# Altium integrated library ib_eps.IntLib: 181 symbols (part 1 of 2) (continued)
## CL0603_2700pF_50V (continued)
CAP CER 2700PF 50V X7R 0603; Manufacturer: Yageo; Manufacturer Part Number: CC0603KRX7R9BB272; Voltage: 50V; Value: 2700pF; Dielectric: X7R; Supplier 1: Digi-Key; Supplier Part Number 1: 311-1809-1-ND
footprint C0603_IPC_HD (Chip Capacitor, 2-Leads, Body 1,60x0,80mm, IPC High Density)
pins: 1, 2

## CL0603_4700pF_50V
designator C?, comment 4700pF
4700pF ±10% 50V Ceramic Capacitor X7R 0603 (1608 Metric); Manufacturer: Wurth Electronics Inc.; Manufacturer Part Number: 885012206087; Voltage: 50V; Value: 4700pF; Dielectric: X7R; Supplier 1: Digi-Key; Supplier Part Number 1: 732-8005-1-ND
footprint C0603_IPC_MD (Chip Capacitor, 2-Leads, Body 1,60x0,80mm, IPC Medium Density)
footprint C0603_IPC_HD (Chip Capacitor, 2-Leads, Body 1,60x0,80mm, IPC High Density)
pins: 1, 2

## CL0805_10uF_25V
designator C?, comment 10uF
10µF ±10% 25V Ceramic Capacitor X5R 0805 (2012 Metric); Manufacturer: Taiyo Yuden; Manufacturer Part Number: TMK212BBJ106KG-T; Dielectric: X7R; Voltage: 25V; Value: 10uF; Supplier 1: Digi-Key; Supplier Part Number 1: 587-2985-1-ND
footprint C0805_IPC_MD (Chip Capacitor, 2-Leads, Body 2,00x1,25mm, IPC Medium Density)
footprint C0805_IPC_HD (Chip Capacitor, 2-Leads, Body 2,00x1,25mm, IPC High Density)
pins: 1, 2

## CL1206_10nF_1000V
designator C?, comment 10nF
CAP CER 10000PF 1000V X7R 1206; Manufacturer: Wurth Electronics Inc.; Manufacturer Part Number: 885342208021; Voltage: 1000V; Value: 10nF; Dielectric: X7R; Supplier 1: Digi-Key; Supplier Part Number 1: 732-12078-1-ND
footprint Chip2Pin1206_10n
footprint C1206_IPC_HD (Chip Capacitor, 2-Leads, Body 3,20x1,60mm, IPC High Density)
footprint C1206_IPC_MD (Chip Capacitor, 2-Leads, Body 3,20x1,60mm, IPC Medium Density)
pins: 1, 2

## CL1206_47uF_10V
designator C?, comment 47µF
CAP CER 47UF 10V X5R 1206; Manufacturer: Samsung Electro-Mechanics; Manufacturer Part Number: CL31A476MPHNNNE; Dielectric: X7R; Voltage: 10V; Value: 47µF; Supplier 1: Digi-Key; Supplier Part Number 1: 1276-3063-1-ND
footprint C1206_IPC_HD (Chip Capacitor, 2-Leads, Body 3,20x1,60mm, IPC High Density)
footprint C1206_IPC_MD (Chip Capacitor, 2-Leads, Body 3,20x1,60mm, IPC Medium Density)
pins: 1, 2

## CM3
designator M?  (mechanical)
COMPUTE MODULE RASPBERRYPI3; Manufacturer: Raspberry Pi; Manufacturer Part Number: CM3; Supplier 1: Digi-Key; Supplier Part Number 1: 1690-1016-ND

## CM3 LITE
designator M?  (mechanical)
COMPUTE MODULE RASPBERRYPI3 LITE; Manufacturer: Raspberry Pi; Manufacturer Part Number: CM3 LITE; Supplier 1: Digi-Key; Supplier Part Number 1: 1690-1017-ND

## CP22uF_16V
designator C?, comment 22µF
CAP 22 UF 20% 16 V; Manufacturer: Wurth Electronics Inc.; Manufacturer Part Number: 865080340003; Voltage: 16V; Dielectric: X7R; Value: 22µF; Supplier 1: Digi-Key; Supplier Part Number 1: 732-8413-1-ND
footprint CP22uF_16VCAPAE4643X55M (Aluminum Electrolytic Capacitor, Body 4,30x4,30x5,50mm, IPC Low Density)
pins: 1, 2

## CP68uF_16V
designator C?, comment 68µF
68µF 16V Aluminum Electrolytic Capacitors Radial, Can - SMD  2000 Hrs @ 105°C; Manufacturer: Panasonic Electronic Components; Manufacturer Part Number: EEE-FK1C680P; Dielectric: X7R; Voltage: 16V; Value: 68µF; Supplier 1: Digi-Key; Supplier Part Number 1: PCE3793CT-ND
footprint EEE-FK1CP68uF_CAPAE6666X58M (Aluminum Electrolytic Capacitor, Body 7,00x6,60x5,80mm, IPC Low Density)
pins: 1, 2

## CP100uF_16V
designator C?, comment 100uF
CAP ALUM 100UF 20% 16V SMD; Manufacturer: Panasonic Electronic Components; Manufacturer Part Number: EEE-HC1C101XP; Dielectric: X7R; Voltage: 16V; Value: 100uF; Supplier 1: Digi-Key; Supplier Part Number 1: PCE3750CT-ND
footprint CAPAE7866X77_100uF16V (Aluminum Electrolytic Capacitor, Body 6,60x6,60x7,70mm, IPC Low Density)
pins: 1, 2

## CP2102N-A01-GQFN28R
designator U?
USB Bridge, USB to UART USB 2.0 UART Interface 28-QFN (5x5); Manufacturer: Silicon Labs; Manufacturer Part Number: CP2102N-A01-GQFN28R; Supplier 1: Digi-Key; Supplier Part Number 1: 336-4738-1-ND
footprint CP2102\9_QFN50P500X500X80_HS-29N (QFN, 28-Leads, Body 5,00x5,00mm, Pitch 0,50mm, Thermal Pad 3,35x3,35mm, IPC Medium Density)
pins: 1 DCD, 2 RI/CLK, 3 GND, 4 D+, 5 D-, 6 VDD, 7 VREGIN, 8 VBUS, 9 ~{RESET}, 10 NC, 11 ~{SUSPEND}, 12 SUSPEND, 13 CHREN, 14 CHR1, 15 CHR0, 16 GPIO.3/WAKEUP, 17 GPIO.2/RS485, 18 GPIO.1/RXT, 19 GPIO.0/TXT, 20 GPIO.6, 21 GPIO.5, 22 GPIO.4, 23 CTS, 24 RTS, 25 RXD, 26 TXD, 27 DSR, 28 DTR, 29 PGND

## CP2102N-A02-GQFN24
designator U?
USB Bridge, USB to UART USB 2.0 UART Interface 24-QFN (4x4); Manufacturer: Silicon Labs; Manufacturer Part Number: CP2102N-A02-GQFN24; Supplier 1: Digi-Key; Supplier Part Number 1: 336-5887-ND
footprint CP2102_QFN50P400X400X80_HS-25N (QFN, 24-Leads, Body 4,00x4,00mm, Pitch 0,50mm, Thermal Pad 2,55x2,55mm, IPC Medium Density)
pins: 1 RI/CLK, 2 GND, 3 D+, 4 D-, 5 VIO, 6 VDD, 7 VREGIN, 8 VBUS, 9 RSTb, 10 NC, 11 GPIO.3/WAKEUP, 12 GPIO.2/RS485, 13 GPIO.1/RXT, 14 GPIO.0/TXT, 15 SUSPENDb, 16 NC, 17 SUSPEND, 18 CTS, 19 RTS, 20 RXD, 21 TXD, 22 DSR, 23 DTR, 24 DCD, 25 PGND

## CPT68uF_16V
designator C?, comment 68µF
68µF Molded Tantalum Polymer Capacitor 16V 2917 (7343 Metric) 50 mOhm; Manufacturer: AVX Corporation; Manufacturer Part Number: TCJY686M016R0050; Dielectric: X7R; Voltage: 16V; Value: 68µF; Supplier 1: Digi-Key; Supplier Part Number 1: 478-9518-1-ND
footprint TCJY686_CAPMP7343X21N (Molded Capacitor, 2-Leads, Body 7,30x4,30mm, IPC Medium Density)
pins: 1, 2

## CR0603-FX-3302
designator R?, comment 33k
RES SMD 33K OHM 1% 1/10W 0603; Manufacturer: Bourns Inc.; Manufacturer Part Number: CR0603-FX-3302ELF; Value: 33k; Tolarance: ±1%; Supplier 1: Digi-Key; Supplier Part Number 1: YAG3389TR-ND
footprint C0603_IPC_MD (Chip Capacitor, 2-Leads, Body 1,60x0,80mm, IPC Medium Density)
footprint C0603_IPC_HD (Chip Capacitor, 2-Leads, Body 1,60x0,80mm, IPC High Density)
pins: 1, 2

## CR0603-J/-000ELF
designator R?, comment 0R
RES SMD 0 OHM JUMPER 1/10W 0603; Manufacturer: Bourns Inc.; Manufacturer Part Number: CR0603-J/-000ELF; Tolarance: 1%; Value: 0R; Supplier 1: Digi-Key; Supplier Part Number 1: CR0603-J/-000ELFCT-ND
footprint C0603_IPC_HD (Chip Capacitor, 2-Leads, Body 1,60x0,80mm, IPC High Density)
footprint C0805_IPC_MD (Chip Capacitor, 2-Leads, Body 2,00x1,25mm, IPC Medium Density)
pins: 1, 2

## CR0603-JW-1k_ISL92
designator R?, comment 1 k
1 kOhms ±1% 0.1W, 1/10W Chip Resistor 0603 (1608 Metric) Automotive AEC-Q200 Thick Film; Manufacturer: Stackpole Electronics Inc; Manufacturer Part Number: RMCF0603FT1K00; Value: 1 k; Tolarance: ±1%; Supplier 1: Digi-Key; Supplier Part Number 1: RMCF0603FT1K00CT-ND
footprint R0603_IPC_HD (Chip Resistor, 2-Leads, Body 1,60x0,80mm, IPC Medium Density)
footprint R0603_IPC_MD (Chip Resistor, 2-Leads, Body 1,60x0,80mm, IPC Medium Density)
pins: 1, 2

## CR0603-JW-2R
designator R?, comment 2R
2 Ohms ±1% 0.125W, 1/8W Chip Resistor 0603 (1608 Metric) Automotive AEC-Q200 Thick Film; Manufacturer: KOA Speer Electronics, Inc.; Manufacturer Part Number: RK73H1JTTD2R00F; Value: 2R; Tolarance: ±1%; Supplier 1: Digi-Key; Supplier Part Number 1: 2019-RK73H1JTTD2R00FCT-ND
footprint C0603_IPC_HD (Chip Capacitor, 2-Leads, Body 1,60x0,80mm, IPC High Density)
footprint C0603_IPC_MD (Chip Capacitor, 2-Leads, Body 1,60x0,80mm, IPC Medium Density)
pins: 1, 2

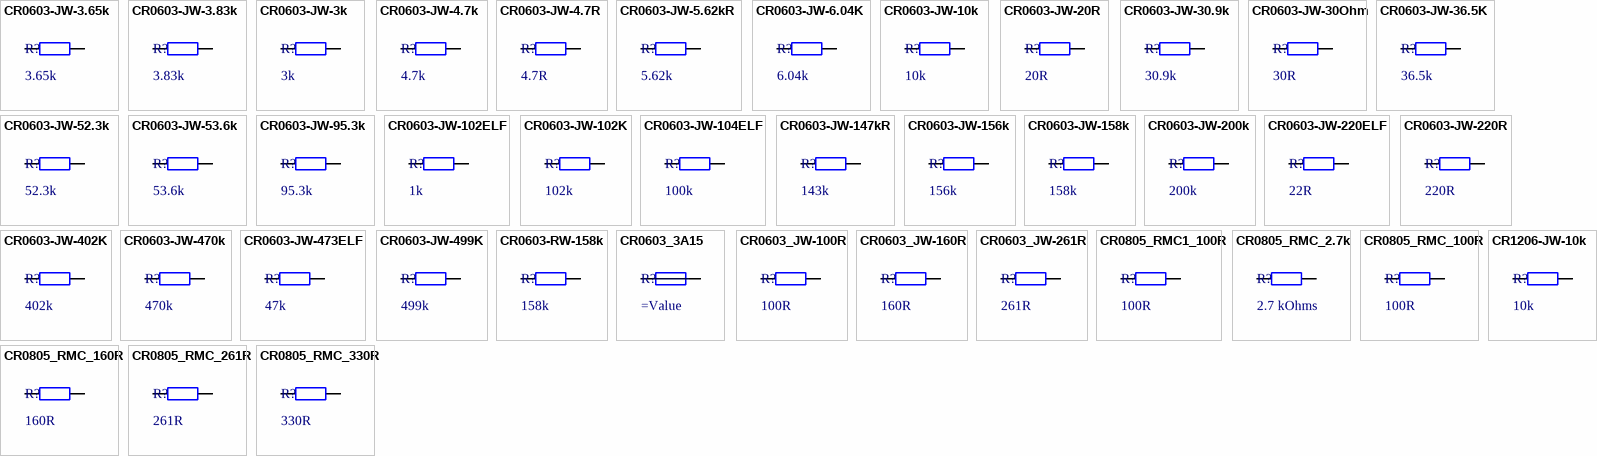
[diagram p3: symbols CR0603-JW-3.65k to CR1206-JW-10k]

## CR0603-JW-3.65k
designator R?, comment 3.65k
RES SMD 3.65K OHM 1% 1/10W 0603; Manufacturer: Yageo; Manufacturer Part Number: RC0603FR-073K65L; Value: 3.65k; Tolarance: ±1%; Supplier 1: Digi-Key; Supplier Part Number 1: 311-3.65KHRCT-ND
footprint C0603_IPC_HD (Chip Capacitor, 2-Leads, Body 1,60x0,80mm, IPC High Density)
pins: 1, 2

## CR0603-JW-3.83k
designator R?, comment 3.83k
RES SMD 3.83K OHM 1% 1/10W 0603; Manufacturer: Yageo; Manufacturer Part Number: RC0603FR-073K83L; Value: 3.83k; Tolarance: ±1%; Supplier 1: Digi-Key; Supplier Part Number 1: 311-3.83KHRCT-ND
footprint C0603_IPC_HD (Chip Capacitor, 2-Leads, Body 1,60x0,80mm, IPC High Density)
pins: 1, 2

## CR0603-JW-3k
designator R?, comment 3k
RES SMD 3K OHM 5% 1/10W 0603; Manufacturer: Bourns Inc.; Manufacturer Part Number: CR0603-JW-302ELF; Value: 3k; Tolarance: ±5%; Supplier 1: Digi-Key; Supplier Part Number 1: CR0603-JW-302ELFCT-ND
footprint C0603_IPC_HD (Chip Capacitor, 2-Leads, Body 1,60x0,80mm, IPC High Density)
footprint C0603_IPC_MD (Chip Capacitor, 2-Leads, Body 1,60x0,80mm, IPC Medium Density)
pins: 1, 2

## CR0603-JW-4.7k
designator R?, comment 4.7k
RES SMD 4.7K OHM 5% 1/10W 0603; Manufacturer: Bourns Inc.; Manufacturer Part Number: CR0603-JW-472ELF; Value: 4.7k; Tolarance: ±5%; Supplier 1: Digi-Key; Supplier Part Number 1: CR0603-JW-472ELFCT-ND
footprint R0603_IPC_HD (Chip Resistor, 2-Leads, Body 1,60x0,80mm, IPC Medium Density)
footprint R0603_IPC_MD (Chip Resistor, 2-Leads, Body 1,60x0,80mm, IPC Medium Density)
pins: 1, 2

## CR0603-JW-4.7R
designator R?, comment 4.7R
RES 4.7 OHM 1% 1/10W 0603; Manufacturer: Stackpole Electronics Inc; Manufacturer Part Number: RMCF0603FT4R70; Value: 4.7R; Tolarance: ±1%; Supplier 1: Digi-Key; Supplier Part Number 1: RMCF0603FT4R70CT-ND
footprint R0603_IPC_HD (Chip Resistor, 2-Leads, Body 1,60x0,80mm, IPC Medium Density)
footprint R0603_IPC_MD (Chip Resistor, 2-Leads, Body 1,60x0,80mm, IPC Medium Density)
pins: 1, 2

## CR0603-JW-5.62kR
designator R?, comment 5.62k
RES 5.62K OHM 1% 1/10W 0603; Manufacturer: Stackpole Electronics Inc; Manufacturer Part Number: RMCF0603FT5K62; Value: 5.62k; Tolarance: ±1%; Supplier 1: Digi-Key; Supplier Part Number 1: RMCF0603FT5K62CT-ND
footprint C0603_IPC_HD (Chip Capacitor, 2-Leads, Body 1,60x0,80mm, IPC High Density)
footprint C0603_IPC_MD (Chip Capacitor, 2-Leads, Body 1,60x0,80mm, IPC Medium Density)
pins: 1, 2

## CR0603-JW-6.04K
designator R?, comment 6.04k
RES 6.04K OHM 1% 1/10W 0603; Manufacturer: Stackpole Electronics Inc; Manufacturer Part Number: RMCF0603FT6K04; Value: 6.04k; Tolarance: ±1%; Supplier 1: Digi-Key; Supplier Part Number 1: RMCF0603FT6K04CT-ND
footprint C0603_IPC_HD (Chip Capacitor, 2-Leads, Body 1,60x0,80mm, IPC High Density)
footprint C0603_IPC_MD (Chip Capacitor, 2-Leads, Body 1,60x0,80mm, IPC Medium Density)
pins: 1, 2

## CR0603-JW-10k
designator R?, comment 10k
RES 10K OHM 1% 1/10W 0603; Manufacturer: Stackpole Electronics Inc; Manufacturer Part Number: RMCF0603FT10K0; Value: 10k; Tolarance: ±1%; Supplier 1: Digi-Key; Supplier Part Number 1: RMCF0603FT10K0CT-ND
footprint C0603_IPC_HD (Chip Capacitor, 2-Leads, Body 1,60x0,80mm, IPC High Density)
footprint C0603_IPC_MD (Chip Capacitor, 2-Leads, Body 1,60x0,80mm, IPC Medium Density)
pins: 1, 2

## CR0603-JW-20R
designator R?, comment 20R
RES 20 OHM 1% 1/10W 0603; Manufacturer: Stackpole Electronics Inc; Manufacturer Part Number: RMCF0603FT20R0; Value: 20R; Tolarance: ±1%; Supplier 1: Digi-Key; Supplier Part Number 1: RMCF0603FT20R0CT-ND
footprint C0603_IPC_HD (Chip Capacitor, 2-Leads, Body 1,60x0,80mm, IPC High Density)
footprint C0603_IPC_MD (Chip Capacitor, 2-Leads, Body 1,60x0,80mm, IPC Medium Density)
pins: 1, 2

## CR0603-JW-30.9k
designator R?, comment 30.9k
RES SMD 30.9K OHM 1% 1/10W 0603; Manufacturer: Yageo; Manufacturer Part Number: RC0603FR-0730K9L; Value: 30.9k; Tolarance: ±1%; Supplier 1: Digi-Key; Supplier Part Number 1: 311-30.9KHRCT-ND
footprint C0603_IPC_HD (Chip Capacitor, 2-Leads, Body 1,60x0,80mm, IPC High Density)
pins: 1, 2

## CR0603-JW-30Ohm
designator R?, comment 30R
RES SMD 30 OHM 5% 1/10W 0603; Manufacturer: Bourns Inc.; Manufacturer Part Number: CR0603-JW-300ELF; Value: 30R; Tolarance: ±5%; Supplier 1: Digi-Key; Supplier Part Number 1: CR0603-JW-300ELFCT-ND
footprint C0603_IPC_HD (Chip Capacitor, 2-Leads, Body 1,60x0,80mm, IPC High Density)
footprint C0603_IPC_MD (Chip Capacitor, 2-Leads, Body 1,60x0,80mm, IPC Medium Density)
pins: 1, 2

## CR0603-JW-36.5K
designator R?, comment 36.5k
RES 36.5K OHM 1% 1/10W 0603; Manufacturer: KOA Speer Electronics, Inc.; Manufacturer Part Number: RK73H1JTTD3652F; Value: 36.5k; Tolarance: ±1%; Supplier 1: Digi-Key; Supplier Part Number 1: 2019-RK73H1JTTD3652FCT-ND
footprint C0603_IPC_HD (Chip Capacitor, 2-Leads, Body 1,60x0,80mm, IPC High Density)
pins: 1, 2

## CR0603-JW-52.3k
designator R?, comment 52.3k
RES SMD 52.3K OHM 1% 1/10W 0603; Manufacturer: Yageo; Manufacturer Part Number: RC0603FR-0752K3L; Value: 52.3k; Tolarance: ±1%; Supplier 1: Digi-Key; Supplier Part Number 1: 311-52.3KHRCT-ND
footprint C0603_IPC_HD (Chip Capacitor, 2-Leads, Body 1,60x0,80mm, IPC High Density)
pins: 1, 2

## CR0603-JW-53.6k
designator R?, comment 53.6k
RES 53.6K OHM 1% 1/10W 0603; Manufacturer: KOA Speer Electronics, Inc.; Manufacturer Part Number: RK73H1JTTD5362F; Value: 53.6k; Tolarance: ±1%; Supplier 1: Digi-Key; Supplier Part Number 1: 2019-RK73H1JTTD5362FCT-ND
footprint C0603_IPC_HD (Chip Capacitor, 2-Leads, Body 1,60x0,80mm, IPC High Density)
pins: 1, 2

## CR0603-JW-95.3k
designator R?, comment 95.3k
RES 95.3K OHM 1% 1/10W 0603; Manufacturer: Stackpole Electronics Inc; Manufacturer Part Number: RMCF0603FT95K3; Value: 95.3k; Tolarance: ±1%; Supplier 1: Digi-Key; Supplier Part Number 1: RMCF0603FT95K3CT-ND
footprint C0603_IPC_HD (Chip Capacitor, 2-Leads, Body 1,60x0,80mm, IPC High Density)
footprint C0603_IPC_MD (Chip Capacitor, 2-Leads, Body 1,60x0,80mm, IPC Medium Density)
pins: 1, 2

## CR0603-JW-102ELF
designator R?, comment 1k
RES SMD 1K OHM 5% 1/10W 0603; Manufacturer: Bourns Inc.; Manufacturer Part Number: CR0603-JW-102ELF; Value: 1k; Tolarance: 5%; Supplier 1: Digi-Key; Supplier Part Number 1: CR0603-JW-102ELFCT-ND
footprint C0603_IPC_HD (Chip Capacitor, 2-Leads, Body 1,60x0,80mm, IPC High Density)
footprint C0603_IPC_MD (Chip Capacitor, 2-Leads, Body 1,60x0,80mm, IPC Medium Density)
pins: 1, 2

## CR0603-JW-102K
designator R?, comment 102k
RES 102K OHM 1% 1/10W 0603; Manufacturer: KOA Speer Electronics, Inc.; Manufacturer Part Number: RK73H1JTTD1023F; Value: 102k; Tolarance: ±1%; Supplier 1: Digi-Key; Supplier Part Number 1: 2019-RK73H1JTTD1023FCT-ND
footprint C0603_IPC_HD (Chip Capacitor, 2-Leads, Body 1,60x0,80mm, IPC High Density)
pins: 1, 2

## CR0603-JW-104ELF
designator R?, comment 100k
RES 100K OHM 1% 1/10W 0603; Manufacturer: Stackpole Electronics Inc; Manufacturer Part Number: RMCF0603FT100K; Value: 100k; Tolarance: ±1%; Supplier 1: Digi-Key; Supplier Part Number 1: RMCF0603FT100KCT-ND
footprint C0603_IPC_HD (Chip Capacitor, 2-Leads, Body 1,60x0,80mm, IPC High Density)
footprint C0603_IPC_MD (Chip Capacitor, 2-Leads, Body 1,60x0,80mm, IPC Medium Density)
footprint R0603_IPC_MD (Chip Resistor, 2-Leads, Body 1,60x0,80mm, IPC Medium Density)
pins: 1, 2

## CR0603-JW-147kR
designator R?, comment 143k
RES 143K OHM 1% 1/10W 0603; Manufacturer: Stackpole Electronics Inc; Manufacturer Part Number: RMCF0603FT143K; Value: 143k; Tolarance: ±1%; Supplier 1: Digi-Key; Supplier Part Number 1: RMCF0603FT143KCT-ND
footprint C0603_IPC_HD (Chip Capacitor, 2-Leads, Body 1,60x0,80mm, IPC High Density)
footprint C0603_IPC_MD (Chip Capacitor, 2-Leads, Body 1,60x0,80mm, IPC Medium Density)
pins: 1, 2

## CR0603-JW-156k
designator R?, comment 156k
RES 156K OHM 0.1% 1/5W 0805; Manufacturer: Vishay Thin Film; Manufacturer Part Number: PTN0805E1563BST1; Value: 156k; Tolarance: ±0.1%; Supplier 1: Digi-Key; Supplier Part Number 1: 764-1485-1-ND
footprint C0603_IPC_HD (Chip Capacitor, 2-Leads, Body 1,60x0,80mm, IPC High Density)
footprint C0603_IPC_MD (Chip Capacitor, 2-Leads, Body 1,60x0,80mm, IPC Medium Density)
pins: 1, 2

## CR0603-JW-158k
designator R?, comment 158k
58K ±1% 1/10W ±100ppm/℃ 0603; Manufacturer: PANASONIC; Manufacturer Part Number: ERJ3EKF1583V; Value: 158k; Tolarance: 1%; Supplier 1: LCSC; Supplier Part Number 1: C403004
footprint R0603_IPC_HD (Chip Resistor, 2-Leads, Body 1,60x0,80mm, IPC Medium Density)
footprint R0603_IPC_MD (Chip Resistor, 2-Leads, Body 1,60x0,80mm, IPC Medium Density)
pins: 1, 2

## CR0603-JW-200k
designator R?, comment 200k
RES 200K OHM 1% 1/10W 0603; Manufacturer: Stackpole Electronics Inc; Manufacturer Part Number: RMCF0603FT200K; Value: 200k; Tolarance: ±1%; Supplier 1: Digi-Key; Supplier Part Number 1: RMCF0603FT200KCT-ND
footprint C0603_IPC_HD (Chip Capacitor, 2-Leads, Body 1,60x0,80mm, IPC High Density)
footprint C0603_IPC_MD (Chip Capacitor, 2-Leads, Body 1,60x0,80mm, IPC Medium Density)
pins: 1, 2

## CR0603-JW-220ELF
designator R?, comment 22R
RES SMD 22 OHM 5% 1/10W 0603; Manufacturer: Bourns Inc.; Manufacturer Part Number: CR0603-JW-220ELF; Value: 22R; Tolarance: 5%; Supplier 1: Digi-Key; Supplier Part Number 1: CR0603-JW-220ELFCT-ND
footprint C0603_IPC_HD (Chip Capacitor, 2-Leads, Body 1,60x0,80mm, IPC High Density)
footprint C0603_IPC_MD (Chip Capacitor, 2-Leads, Body 1,60x0,80mm, IPC Medium Density)
pins: 1, 2

## CR0603-JW-220R
designator R?, comment 220R
RES 220 OHM 1% 1/10W 0603; Manufacturer: Stackpole Electronics Inc; Manufacturer Part Number: RMCF0603FT220R; Value: 220R; Tolarance: ±1%; Supplier 1: Digi-Key; Supplier Part Number 1: RMCF0603FT220RCT-ND
footprint C0603_IPC_HD (Chip Capacitor, 2-Leads, Body 1,60x0,80mm, IPC High Density)
footprint C0603_IPC_MD (Chip Capacitor, 2-Leads, Body 1,60x0,80mm, IPC Medium Density)
pins: 1, 2

## CR0603-JW-402K
designator R?, comment 402k
RES 402K OHM 1% 1/10W 0603; Manufacturer: Stackpole Electronics Inc; Manufacturer Part Number: RMCF0603FT402K; Value: 402k; Tolarance: ±1%; Supplier 1: Digi-Key; Supplier Part Number 1: RMCF0603FT402KCT-ND
footprint C0603_IPC_HD (Chip Capacitor, 2-Leads, Body 1,60x0,80mm, IPC High Density)
footprint C0603_IPC_MD (Chip Capacitor, 2-Leads, Body 1,60x0,80mm, IPC Medium Density)
pins: 1, 2

## CR0603-JW-470k
designator R?, comment 470k
RES SMD 470K OHM 5% 1/10W 0603; Manufacturer: Bourns Inc.; Manufacturer Part Number: CR0603-JW-474ELF; Value: 470k; Tolarance: ±5%; Supplier 1: Digi-Key; Supplier Part Number 1: CR0603-JW-474ELFCT-ND
footprint C0603_IPC_HD (Chip Capacitor, 2-Leads, Body 1,60x0,80mm, IPC High Density)
footprint C0603_IPC_MD (Chip Capacitor, 2-Leads, Body 1,60x0,80mm, IPC Medium Density)
pins: 1, 2

## CR0603-JW-473ELF
designator R?, comment 47k
RES SMD 47K OHM 5% 1/10W 0603; Manufacturer: Bourns Inc.; Manufacturer Part Number: CR0603-JW-473ELF; Value: 47k; Tolarance: 5%; Supplier 1: Digi-Key; Supplier Part Number 1: CR0603-JW-473ELFCT-ND
footprint R0603_IPC_HD (Chip Resistor, 2-Leads, Body 1,60x0,80mm, IPC Medium Density)
footprint R0603_IPC_MD (Chip Resistor, 2-Leads, Body 1,60x0,80mm, IPC Medium Density)
pins: 1, 2

## CR0603-JW-499K
designator R?, comment 499k
RES 499K OHM 1% 1/10W 0603; Manufacturer: Stackpole Electronics Inc; Manufacturer Part Number: RMCF0603FT499K; Value: 499k; Tolarance: ±1%; Supplier 1: Digi-Key; Supplier Part Number 1: RMCF0603FT499KCT-ND
footprint C0603_IPC_HD (Chip Capacitor, 2-Leads, Body 1,60x0,80mm, IPC High Density)
footprint C0603_IPC_MD (Chip Capacitor, 2-Leads, Body 1,60x0,80mm, IPC Medium Density)
pins: 1, 2

## CR0603-RW-158k
designator R?, comment 158k
RES SMD 158K OHM 1% 1/10W 0603; Manufacturer: Yageo; Manufacturer Part Number: RC0603FR-07158KL; Value: 158k; Tolarance: 1%; Supplier 1: digikey.com; Supplier Part Number 1: 311-158KHRCT-ND
footprint R0603_IPC_HD (Chip Resistor, 2-Leads, Body 1,60x0,80mm, IPC Medium Density)
footprint R0603_IPC_MD (Chip Resistor, 2-Leads, Body 1,60x0,80mm, IPC Medium Density)
pins: 1, 2

## CR0603_3A15
designator R?
FUSE BOARD MNT 3.15A 32VDC 0603; Manufacturer: Panasonic Electronic Components; Manufacturer Part Number: ERB-RE3R15V; Current Rating: 3.15A; Supplier 1: Digi-Key; Supplier Part Number 1: P121393CT-ND
footprint C0603_IPC_MD (Chip Capacitor, 2-Leads, Body 1,60x0,80mm, IPC Medium Density)
pins: 1, 2

## CR0603_JW-100R
designator R?, comment 100R
RES 100 OHM 1% 1/10W 0603; Manufacturer: Stackpole Electronics Inc; Manufacturer Part Number: RMCF0603FG100R; Value: 100R; Tolarance: 1%; Supplier 1: Digi-Key; Supplier Part Number 1: RMCF0603FG100RCT-ND
footprint C0603_IPC_HD (Chip Capacitor, 2-Leads, Body 1,60x0,80mm, IPC High Density)
footprint C0603_IPC_MD (Chip Capacitor, 2-Leads, Body 1,60x0,80mm, IPC Medium Density)
pins: 1, 2

## CR0603_JW-160R
designator R?, comment 160R
RES 160 OHM 1% 1/10W 0603; Manufacturer: Stackpole Electronics Inc; Manufacturer Part Number: RMCF0603FT160R; Value: 160R; Tolarance: 1%; Supplier 1: Digi-Key; Supplier Part Number 1: RMCF0603FT160RCT-ND
footprint C0603_IPC_HD (Chip Capacitor, 2-Leads, Body 1,60x0,80mm, IPC High Density)
footprint C0603_IPC_MD (Chip Capacitor, 2-Leads, Body 1,60x0,80mm, IPC Medium Density)
pins: 1, 2

## CR0603_JW-261R
designator R?, comment 261R
RES 261 OHM 1% 1/10W 0603; Manufacturer: Stackpole Electronics Inc; Manufacturer Part Number: RMCF0603FT261R; Value: 261R; Tolarance: 1%; Supplier 1: Digi-Key; Supplier Part Number 1: RMCF0603FT261RCT-ND
footprint C0603_IPC_HD (Chip Capacitor, 2-Leads, Body 1,60x0,80mm, IPC High Density)
footprint C0603_IPC_MD (Chip Capacitor, 2-Leads, Body 1,60x0,80mm, IPC Medium Density)
pins: 1, 2

## CR0805_RMC1_100R
designator R?, comment 100R
RES 100 OHM 1% 1/8W 0805; Manufacturer: Stackpole Electronics Inc; Manufacturer Part Number: RMCF0805FT100R; Value: 100R; Tolarance: ±1%; Supplier 1: Digi-Key; Supplier Part Number 1: RMCF0805FT100RCT-ND
footprint C0805_IPC_HD (Chip Capacitor, 2-Leads, Body 2,00x1,25mm, IPC High Density)
footprint C0805_IPC_MD (Chip Capacitor, 2-Leads, Body 2,00x1,25mm, IPC Medium Density)
footprint R0805_IPC_MD (Chip Resistor, 2-Leads, Body 2,00x1,25mm, IPC Medium Density)
pins: 1, 2

## CR0805_RMC_2.7k
designator R?, comment 2.7 kOhms
RES 2.7K OHM 1% 1/8W 0805; Manufacturer: Stackpole Electronics Inc; Manufacturer Part Number: RMCF0805FT2K70; Value: 2.7 kOhms; Tolarance: 1%; Supplier 1: Digi-Key; Supplier Part Number 1: RMCF0805FT2K70CT-ND
footprint C0805_IPC_HD (Chip Capacitor, 2-Leads, Body 2,00x1,25mm, IPC High Density)
footprint C0805_IPC_MD (Chip Capacitor, 2-Leads, Body 2,00x1,25mm, IPC Medium Density)
pins: 1, 2

## CR0805_RMC_100R
designator R?, comment 100R
RES SMD 100 OHM 5% 1/8W 0805; Manufacturer: Bourns Inc.; Manufacturer Part Number: CR0805-JW-101ELF; Value: 100R; Tolarance: ±5%; Supplier 1: Digi-Key; Supplier Part Number 1: CR0805-JW-101ELFCT-ND
footprint C0805_IPC_HD (Chip Capacitor, 2-Leads, Body 2,00x1,25mm, IPC High Density)
footprint C0805_IPC_MD (Chip Capacitor, 2-Leads, Body 2,00x1,25mm, IPC Medium Density)
pins: 1, 2

## CR0805_RMC_160R
designator R?, comment 160R
RES SMD 160 OHM 1% 1/8W 0805; Manufacturer: Rohm Semiconductor; Manufacturer Part Number: MCR10ERTF1600; Value: 160R; Tolarance: 1%; Supplier 1: Digi-Key; Supplier Part Number 1: RHM160CHCT-ND
footprint C0805_IPC_HD (Chip Capacitor, 2-Leads, Body 2,00x1,25mm, IPC High Density)
footprint C0805_IPC_MD (Chip Capacitor, 2-Leads, Body 2,00x1,25mm, IPC Medium Density)
pins: 1, 2

## CR0805_RMC_261R
designator R?, comment 261R
RES SMD 261 OHM 1% 1/8W 0805; Manufacturer: Rohm Semiconductor; Manufacturer Part Number: MCR10ERTF2610; Value: 261R; Tolarance: 1%; Supplier 1: Digi-Key; Supplier Part Number 1: RHM261CHCT-ND
footprint C0805_IPC_HD (Chip Capacitor, 2-Leads, Body 2,00x1,25mm, IPC High Density)
footprint C0805_IPC_MD (Chip Capacitor, 2-Leads, Body 2,00x1,25mm, IPC Medium Density)
pins: 1, 2

## CR0805_RMC_330R
designator R?, comment 330R
RES 330 OHM 1% 1/8W 0805; Manufacturer: Stackpole Electronics Inc; Manufacturer Part Number: RMCF0805FT330R; Value: 330R; Tolarance: 1%; Supplier 1: Digi-Key; Supplier Part Number 1: RMCF0805FT330RCT-ND
footprint C0805_IPC_HD (Chip Capacitor, 2-Leads, Body 2,00x1,25mm, IPC High Density)
footprint C0805_IPC_MD (Chip Capacitor, 2-Leads, Body 2,00x1,25mm, IPC Medium Density)
pins: 1, 2

## CR1206-JW-10k
designator R?, comment 10k
RES SMD 10K OHM 5% 1/4W 1206; Manufacturer: Bourns Inc.; Manufacturer Part Number: CR1206-JW-103ELF; Value: 10k; Tolarance: ±5%; Supplier 1: Digi-Key; Supplier Part Number 1: CR1206-JW-103ELFCT-ND
footprint C1206_IPC_HD (Chip Capacitor, 2-Leads, Body 3,20x1,60mm, IPC High Density)
footprint C1206_IPC_MD (Chip Capacitor, 2-Leads, Body 3,20x1,60mm, IPC Medium Density)
pins: 1, 2

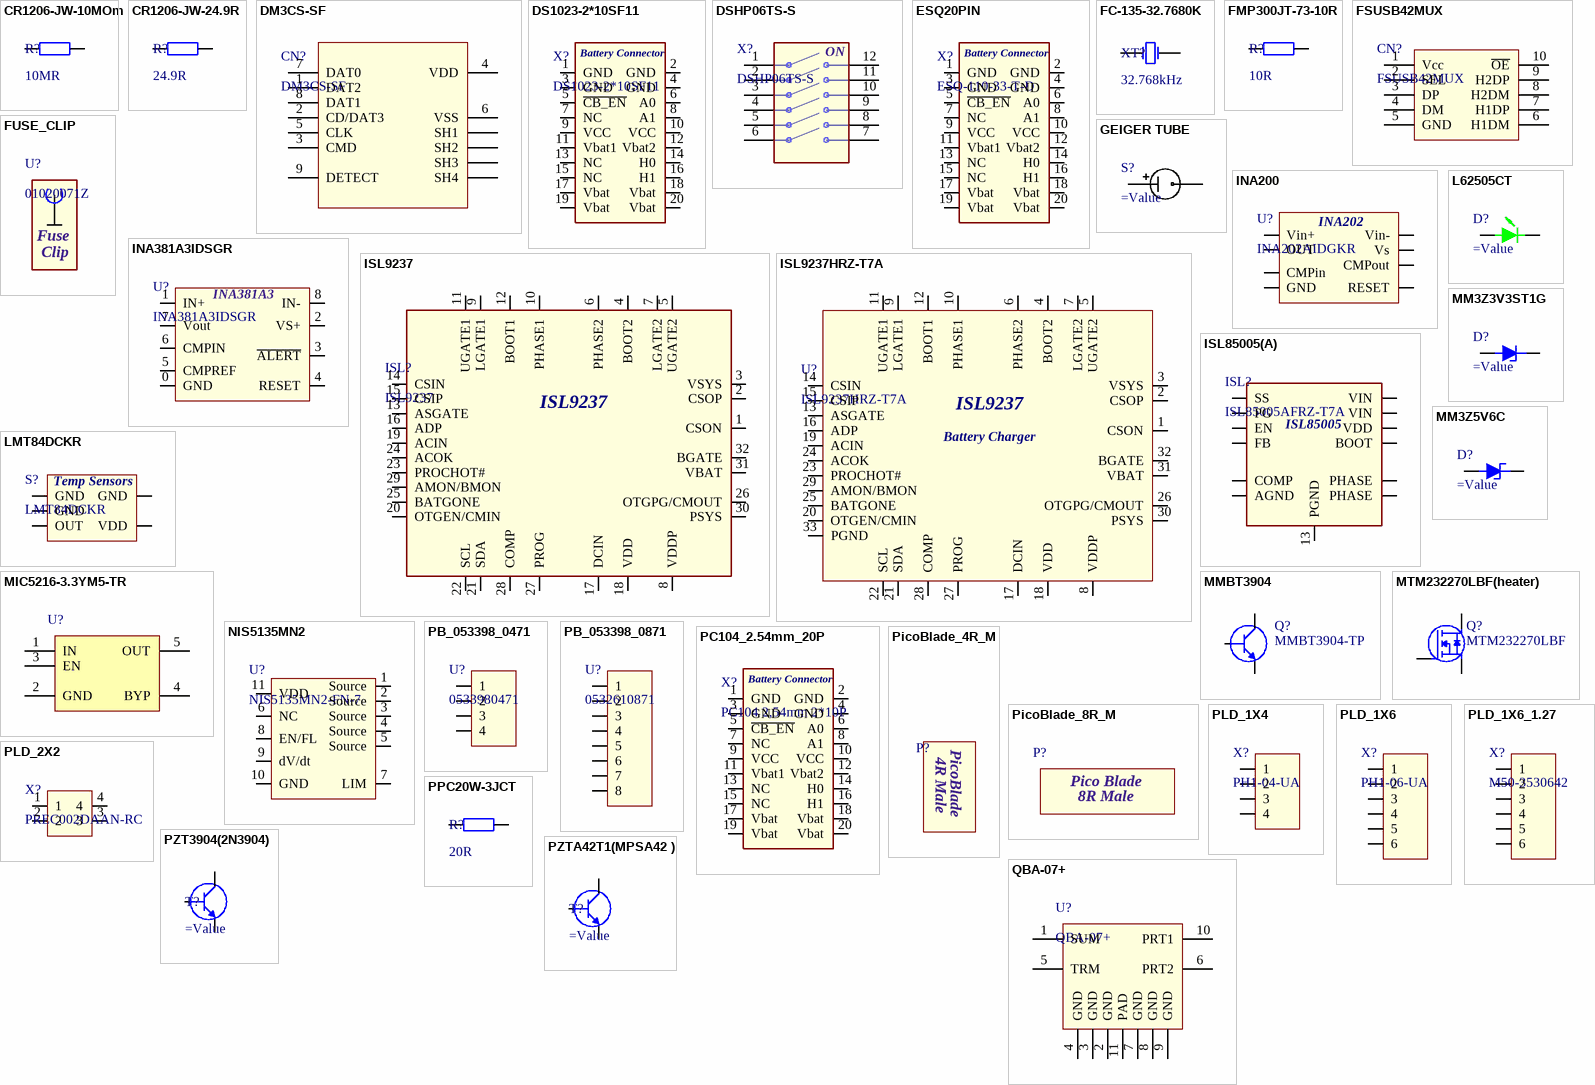
[diagram p4: symbols CR1206-JW-10MOm to QBA-07+]

## CR1206-JW-10MOm
designator R?, comment 10MR
RES SMD 10M OHM 5% 1/4W 1206; Manufacturer: Bourns Inc.; Manufacturer Part Number: CR1206-JW-106ELF; Value: 10MR; Tolarance: ±5%; Supplier 1: Digi-Key; Supplier Part Number 1: CR1206-JW-106ELFCT-ND
footprint C1206_IPC_HD (Chip Capacitor, 2-Leads, Body 3,20x1,60mm, IPC High Density)
footprint C1206_IPC_MD (Chip Capacitor, 2-Leads, Body 3,20x1,60mm, IPC Medium Density)
pins: 1, 2

## CR1206-JW-24.9R
designator R?, comment 24.9R
RES SMD 24.9 OHM 1% 1/4W 1206; Manufacturer: Rohm Semiconductor; Manufacturer Part Number: MCR18ERTF24R9; Value: 24.9R; Tolarance: ±1%; Supplier 1: Digi-Key; Supplier Part Number 1: RHM24.9CJCT-ND
footprint C1206_IPC_HD (Chip Capacitor, 2-Leads, Body 3,20x1,60mm, IPC High Density)
pins: 1, 2

## DM3CS-SF
designator CN?
CONN MICRO SD CARD HINGED TYPE; Manufacturer: Hirose Electric Co Ltd; Manufacturer Part Number: DM3CS-SF; Supplier 1: Digi-Key; Supplier Part Number 1: HR1972CT-ND
footprint DM3CS-SF (CONN MICRO SD CARD HINGED TYPE)
pins: 1 DAT2, 2 CD/DAT3, 3 CMD, 4 VDD, 5 CLK, 6 VSS, 7 DAT0, 8 DAT1, 9 DETECT, SH1, SH2, SH3, SH4

## DS1023-2*10SF11
designator X?
20 Position Elevated Socket Connector  Through Hole; Manufacturer: CONNFLY Elec; Number of Positions: 20; Manufacturer Part Number: DS1023-2*10SF11; Supplier 1: lcsc.com; Supplier Part Number 1: C92266
footprint ESQ-110-33-T-D (CONN SOCKET 20POS 0.1 TIN PCB)
pins: 1 GND, 2 GND, 3 GND, 4 GND, 5 ~{CB_EN}, 6 A0, 7 NC, 8 A1, 9 VCC, 10 VCC, 11 Vbat1, 12 Vbat2, 13 NC, 14 H0, 15 NC, 16 H1, 17 Vbat, 18 Vbat, 19 Vbat, 20 Vbat
text: Battery Connector

## DSHP06TS-S
designator X?
SPST 6 1.27mm, Half Slide (Standard) Black SMD DIP Switches RoHS; Manufacturer: XKB Enterprise; Manufacturer Part Number: DSHP06TS-S; Supplier 1: lcsc.com; Supplier Part Number 1: C319048
footprint SOIC_SW_SOIC127P850X235-12N (SOIC, 12-Leads, Body 9,22x5,35mm, Pitch 1,27mm, IPC Medium Density)
pins: 1, 2, 3, 4, 5, 6, 7, 8, 9, 10, 11, 12
text: ON

## ESQ20PIN
designator X?, comment ESQ-110-33-T-D
20 Position Elevated Socket Connector  Through Hole; Manufacturer: Samtec Inc.; Number of Positions: 20; Manufacturer Part Number: ESQ-110-33-T-D; Supplier 1: Digi-Key; Supplier Part Number 1: SAM11098-ND
footprint ESQ-110-33-T-D (CONN SOCKET 20POS 0.1 TIN PCB)
pins: 1 GND, 2 GND, 3 GND, 4 GND, 5 ~{CB_EN}, 6 A0, 7 NC, 8 A1, 9 VCC, 10 VCC, 11 Vbat1, 12 Vbat2, 13 NC, 14 H0, 15 NC, 16 H1, 17 Vbat, 18 Vbat, 19 Vbat, 20 Vbat
text: Battery Connector

## FC-135-32.7680K
designator XT?, comment 32.768kHz
32.768kHz ±20ppm Crystal 12.5pF 70 kOhms 2-SMD, No Lead; Manufacturer: EPSON; Manufacturer Part Number: FC-135 32.7680KA-A5; Frequency: 32.768kHz; Tolarance: ±20ppm; Supplier 1: Digi-Key; Supplier Part Number 1: SER4103CT-ND
footprint FC-135R (FC-135 32.7680KA-A5.FC-135 32.7680KA-A5)
pins: 1 OSC1, 2 OSC2

## FMP300JT-73-10R
designator R?, comment 10R
RES 10 OHM 3W 5% AXIAL; Manufacturer: Yageo; Manufacturer Part Number: FMP300JT-73-10R; Value: 10R; Tolarance: ±5%; Supplier 1: Digi-Key; Supplier Part Number 1: 10AXCT-ND
footprint FMP300JT-73-10R (RES 10 OHM 3W 5% AXIAL)
pins: 1, 2

## FSUSB42MUX
designator CN?
IC USB SWITCH DPDT 10MSOP; Manufacturer: ON Semiconductor; Manufacturer Part Number: FSUSB42MUX; Supplier 1: Digi-Key; Supplier Part Number 1: FSUSB42MUXCT-ND
footprint MSOP-10 (TSSOP, 10-Leads, Body 3.00x3.00mm, Pitch 0.50mm, IPC High Density)
pins: 1 Vcc, 2 SEL, 3 DP, 4 DM, 5 GND, 6 H1DM, 7 H1DP, 8 H2DM, 9 H2DP, 10 ~{OE}

## FUSE_CLIP
designator U?, comment 01020071Z  (mechanical)
FUSE CLIP; Manufacturer: Littelfuse Inc.; Manufacturer Part Number: 01020071Z; Supplier 1: Digi-Key; Supplier Part Number 1: F3781-ND
text: Fuse; Clip

## GEIGER TUBE
designator S?
FUSE CLIP CARTRIDGE PCB (FOR GEIGER TUBE); Manufacturer: USSR; Manufacturer Part Number: SI-3BG; Supplier 1: Kharkiv; Supplier Part Number 1: SI-3BG
footprint SI-3BG (Geiger tube 400V)
footprint SBM-20 (Geiger tube 400V)
pins: 1, 2

## INA200
designator U?, comment INA202AIDGKR
IC CURRENT MONITOR 3.5% 8VSSOP; Manufacturer: Texas Instruments; Manufacturer Part Number: INA202AIDGKR; Supplier 1: Digi-Key; Supplier Part Number 1: 296-21333-1-ND
footprint SOIC127P600-INA200
footprint TSOP65P490X110-8N-(INA202) (TSOP, 8-Leads, Body 3,00x3,00mm, Pitch 0,65mm, IPC Medium Density)
pins: 1 Vs, 2 OUT, 3 CMPin, 4 GND, 5 RESET, 6 CMPout, 7 Vin-, 8 Vin+
text: INA202

## INA381A3IDSGR
designator U?
Current Sense Regulator High/Low-Side  8-WSON (2x2); Manufacturer: Texas Instruments; Manufacturer Part Number: INA381A3IDSGR; Supplier 1: Digi-Key; Supplier Part Number 1: 296-50476-1-ND
footprint SON127P600-8N(INA381)
pins: 0 GND, 1 IN+, 2 VS+, 3 ~{ALERT}, 4 RESET, 5 CMPREF, 6 CMPIN, 7 Vout, 8 IN-
text: INA381A3

## ISL9237
designator ISL?
Buck-Boost Narrow VDC Battery Charger with SMBus Interface
footprint QFN127P600-ISL9237
pins: 1 CSON, 2 CSOP, 3 VSYS, 4 BOOT2, 5 UGATE2, 6 PHASE2, 7 LGATE2, 8 VDDP, 9 LGATE1, 10 PHASE1, 11 UGATE1, 12 BOOT1, 13 ASGATE, 14 CSIN, 15 CSIP, 16 ADP, 17 DCIN, 18 VDD, 19 ACIN, 20 OTGEN/CMIN, 21 SDA, 22 SCL, 23 PROCHOT#, 24 ACOK, 25 BATGONE, 26 OTGPG/CMOUT, 27 PROG, 28 COMP, 29 AMON/BMON, 30 PSYS, 31 VBAT, 32 BGATE

## ISL9237HRZ-T7A
designator U?
Charger IC Lithium-Ion 32-QFN (4x4); Manufacturer: Renesas Electronics America Inc.; Manufacturer Part Number: ISL9237HRZ-T7A; Supplier 1: Digi-Key; Supplier Part Number 1: ISL9237HRZ-T7ACT-ND
footprint QFN127P600-ISL9237
pins: 1 CSON, 2 CSOP, 3 VSYS, 4 BOOT2, 5 UGATE2, 6 PHASE2, 7 LGATE2, 8 VDDP, 9 LGATE1, 10 PHASE1, 11 UGATE1, 12 BOOT1, 13 ASGATE, 14 CSIN, 15 CSIP, 16 ADP, 17 DCIN, 18 VDD, 19 ACIN, 20 OTGEN/CMIN, 21 SDA, 22 SCL, 23 PROCHOT#, 24 ACOK, 25 BATGONE, 26 OTGPG/CMOUT, 27 PROG, 28 COMP, 29 AMON/BMON, 30 PSYS, 31 VBAT, 32 BGATE, 33 PGND
text: ISL9237; Battery Charger

## ISL85005(A)
designator ISL?, comment ISL85005AFRZ-T7A
Buck Switching Regulator IC Positive Adjustable 5V; Manufacturer: Renesas Electronics America Inc.; Manufacturer Part Number: ISL85005AFRZ-T7A; Supplier 1: Digi-Key; Supplier Part Number 1: ISL85005AFRZ-T7ACT-ND
footprint QFN127P600_ISL85005
pins: 1 SS, 2 PG, 3 EN, 4 FB, 5 COMP, 6 AGND, 7 PHASE, 8 PHASE, 9 VIN, 10 VIN, 11 VDD, 12 BOOT, 13 PGND
text: ISL85005

## L62505CT
designator D?
Green  LED Indication - Discrete 2.1V 0805 (ISL9237); Manufacturer: Visual Communications Company - VCC; Manufacturer Part Number: CMD17-21VGD/TR8; Current - Test: 20mA; Voltage - Forward (Vf) (Typ): 2.1V; Supplier 1: Digi-Key; Supplier Part Number 1: L62505CT-ND
footprint C0805_LED (Chip Capacitor, 2-Leads, Body 2,00x1,25mm, IPC Medium Density)
pins: 1 A, 2 K

## LMT84DCKR
designator S?
Temperature Sensor Analog, Local -50°C ~ 150°C 5.5mV/°C SC-70-5; Manufacturer: Texas Instruments; Manufacturer Part Number: LMT84DCKR; Supplier 1: Digi-Key; Supplier Part Number 1: 296-38163-1-ND
footprint LMT84DCKR_SOT65P210X110-5N (SOT23, 5-Leads, Body 2,00x2,10mm, Pitch 0,65mm, IPC Medium Density)
pins: 1 GND, 2 GND, 3 OUT, 4 VDD, 5 GND
text: Temp Sensors

## MIC5216-3.3YM5-TR
designator U?  (value not drawn)
IC REG LINEAR 3.3V 500MA SOT23-5; Manufacturer: Microchip Technology; Manufacturer Part Number: MIC5216-3.3YM5-TR; Supplier 1: Digi-Key; Supplier Part Number 1: 576-2756-1-ND
footprint SOT23-5_(MT) (SOT23, 5-Leads, Body 2,90x2,80mm, Pitch 0,95mm, IPC Medium Density)
pins: 1 IN, 2 GND, 3 EN, 4 BYP, 5 OUT

## MM3Z3V3ST1G
designator D?
Zener Diode 3.3V 300mW ±3% Surface Mount SOD-323; Manufacturer: ON Semiconductor; Manufacturer Part Number: MM3Z3V3ST1G; Voltage - Zener (Nom) (Vz): 3V3; Reverse Recovery Time (trr): 250ns; Supplier 1: Digi-Key; Supplier Part Number 1: MM3Z3V3ST1GOSCT-ND
footprint MM3Z5V6C _DIOM1713X10N (Molded Diode, 2-Leads, Body 1,70x1,30mm, IPC Medium Density)
pins: 1, 2

## MM3Z5V6C
designator D?
DIODE ZENER 5.6V 200MW SOD323F; Manufacturer: ON Semiconductor; Manufacturer Part Number: MM3Z5V6C; Current - Reverse Leakage @ Vr: 900nA; Voltage - Zener (Nom) (Vz): 5.6V; Supplier 1: Digi-Key; Supplier Part Number 1: MM3Z5V6CCT-ND
footprint MM3Z5V6C _DIOM1713X10N (Molded Diode, 2-Leads, Body 1,70x1,30mm, IPC Medium Density)
pins: 1, 2

## MMBT3904
designator Q?, comment MMBT3904-TP
NPN General Purpose Transistor; Manufacturer: Micro Commercial Co; Manufacturer Part Number: MMBT3904-TP; Supplier 1: Digi-Key; Supplier Part Number 1: MMBT3904TPMSCT-ND
footprint SOT23_MMBT3904 (SOT23, 3-Leads, Body 2,92x2,37mm, Pitch 1,00mm, IPC Medium Density)
pins: 1 B, 2 E, 3 C

## MTM232270LBF(heater)
designator Q?, comment MTM232270LBF
N-Channel 20V 2A (Ta) 500mW (Ta) Surface Mount SMini3-G1-B; Manufacturer: Panasonic Electronic Components; Manufacturer Part Number: MTM232270LBF; Supplier 1: Digi-Key; Supplier Part Number 1: MTM232270LBFCT-ND
footprint MTM232270LBF_SOT65P210X100-3N (SOT23, 3-Leads, Body 2,00x2,10mm, Pitch 0,65mm, IPC Medium Density)
pins: 1 G, 2 S, 3 D

## NIS5135MN2
designator U?, comment NIS5135MN2-FN-7
Electronic Fuse Regulator High-Side 3.6A U-DFN3030-10; Manufacturer: Diodes Incorporated; Manufacturer Part Number: NIS5135MN2-FN-7; Supplier 1: Digi-Key; Supplier Part Number 1: NIS5135MN2-FN-7DICT-ND
footprint NIS5135_SON127P600-8N
pins: 1 Source, 2 Source, 3 Source, 4 Source, 5 Source, 6 NC, 7 LIM, 8 EN/FL, 9 dV/dt, 10 GND, 11 VDD

## PB_053398_0471
designator U?, comment 0533980471
Connector Header Surface Mount 4 position 0.049" (1.25mm); Manufacturer: Molex; Manufacturer Part Number: 0533980471; Supplier 1: Digi-Key; Supplier Part Number 1: WM7608TR-ND
footprint PB_53261-0471
footprint PB_53261-0471_Right
pins: 1, 2, 3, 4

## PB_053398_0871
designator U?, comment 0532610871
Connector Header Surface Mount, Right Angle 8 position 0.049" (1.25mm); Manufacturer: Molex; Manufacturer Part Number: 0532610871; Supplier 1: Digi-Key; Supplier Part Number 1: WM7626CT-ND
footprint PB_53398-0871 (Headers & Wire Housings 1.25MM HDR 8 CKT Right-Angle)
pins: 1, 2, 3, 4, 5, 6, 7, 8

## PC104_2.54mm_20P
designator X?, comment PC104 2,54mm 2*10P
20 Position Elevated Socket Connector  Through Hole; Manufacturer: China; Number of Positions: 20; Manufacturer Part Number: PC104 2,54mm 2*10P; Supplier 1: Aliexpress.com; Supplier Part Number 1: PC104 2,54mm 2*10P
footprint ESQ-110-33-T-D (CONN SOCKET 20POS 0.1 TIN PCB)
footprint PC104_2.54MM_20P (CONN SOCKET 20POS 0.1 TIN PCB)
pins: 1 GND, 2 GND, 3 GND, 4 GND, 5 ~{CB_EN}, 6 A0, 7 NC, 8 A1, 9 VCC, 10 VCC, 11 Vbat1, 12 Vbat2, 13 NC, 14 H0, 15 NC, 16 H1, 17 Vbat, 18 Vbat, 19 Vbat, 20 Vbat
text: Battery Connector

## PicoBlade_4R_M
designator P?, comment PicoBlade_4R_MALE  (value not drawn)  (mechanical)
MALE Connector Header Surface Mount 4 position 0.049" (1.25mm); Manufacturer: China; Manufacturer Part Number: PicoBlade_4R_MALE; Supplier 1: Aliexpress; Supplier Part Number 1: PicoBlade_4R_M
text: PicoBlade; 4R Male

## PicoBlade_8R_M
designator P?, comment PicoBlade_8R_MALE  (value not drawn)  (mechanical)
MALE Connector Header Surface Mount, Right Angle 8 position 0.049" (1.25mm); Manufacturer: China; Manufacturer Part Number: PicoBlade_8R_MALE; Supplier 1: Aliexpress; Supplier Part Number 1: PicoBlade_8R_M
text: Pico Blade; 8R Male

## PLD_1X4
designator X?, comment PH1-04-UA
PIN HEADER 4P 2.54MM PITCH PLUG; Manufacturer: Adam Tech; Number of Positions: 4; Manufacturer Part Number: PH1-04-UA; Supplier 1: Digi-Key; Supplier Part Number 1: 2057-PH1-04-UA-ND
footprint PLS_1X4 (CONN SOCKET 20POS 0.1 TIN PCB)
pins: 1, 2, 3, 4

## PLD_1X6
designator X?, comment PH1-06-UA
PIN HEADER 6P 2.54MM PITCH PLUG; Manufacturer: Adam Tech; Number of Positions: 6; Manufacturer Part Number: PH1-06-UA; Supplier 1: Digi-Key; Supplier Part Number 1: 2057-PH1-06-UA-ND
footprint PLS_1X6 (CONN SOCKET 20POS 0.1 TIN PCB)
pins: 1, 2, 3, 4, 5, 6

## PLD_1X6_1.27
designator X?, comment M50-3530642
CONN HEADER VERT 6POS 1.27MM; Manufacturer: Harwin Inc.; Number of Positions: 6; Manufacturer Part Number: M50-3530642; Supplier 1: Digi-Key; Supplier Part Number 1: 952-3602-ND
footprint PLS_1X6_1.27 (3.10mm, 4.60mm, 5.40mm)
pins: 1, 2, 3, 4, 5, 6

## PLD_2X2
designator X?, comment PREC002DAAN-RC
Connector Header Through Hole 4 position 0.100" (2.54mm); Manufacturer: Sullins Connector Solutions; Number of Positions: 4; Manufacturer Part Number: PREC002DAAN-RC; Supplier 1: Digi-Key; Supplier Part Number 1: S2012EC-02-ND
footprint PLD_2X2 (CONN SOCKET 20POS 0.1 TIN PCB)
footprint GPLD_2X2 (CONN SOCKET 20POS 0.1 TIN PCB)
pins: 1, 2, 3, 4